# Altium footprint library MyLib.PcbLib: 575 footprints (part 4 of 36)
Each footprint in its own frame and in the unit in brackets; x right, y up, seen from the top. Pads: shape width x height; smd on the part's side, far side on the other; paste and mask are expansions set on the pad; w line width, h text height; cw(c..) or ccw(c..) is an arc to the next point about the centre after c.
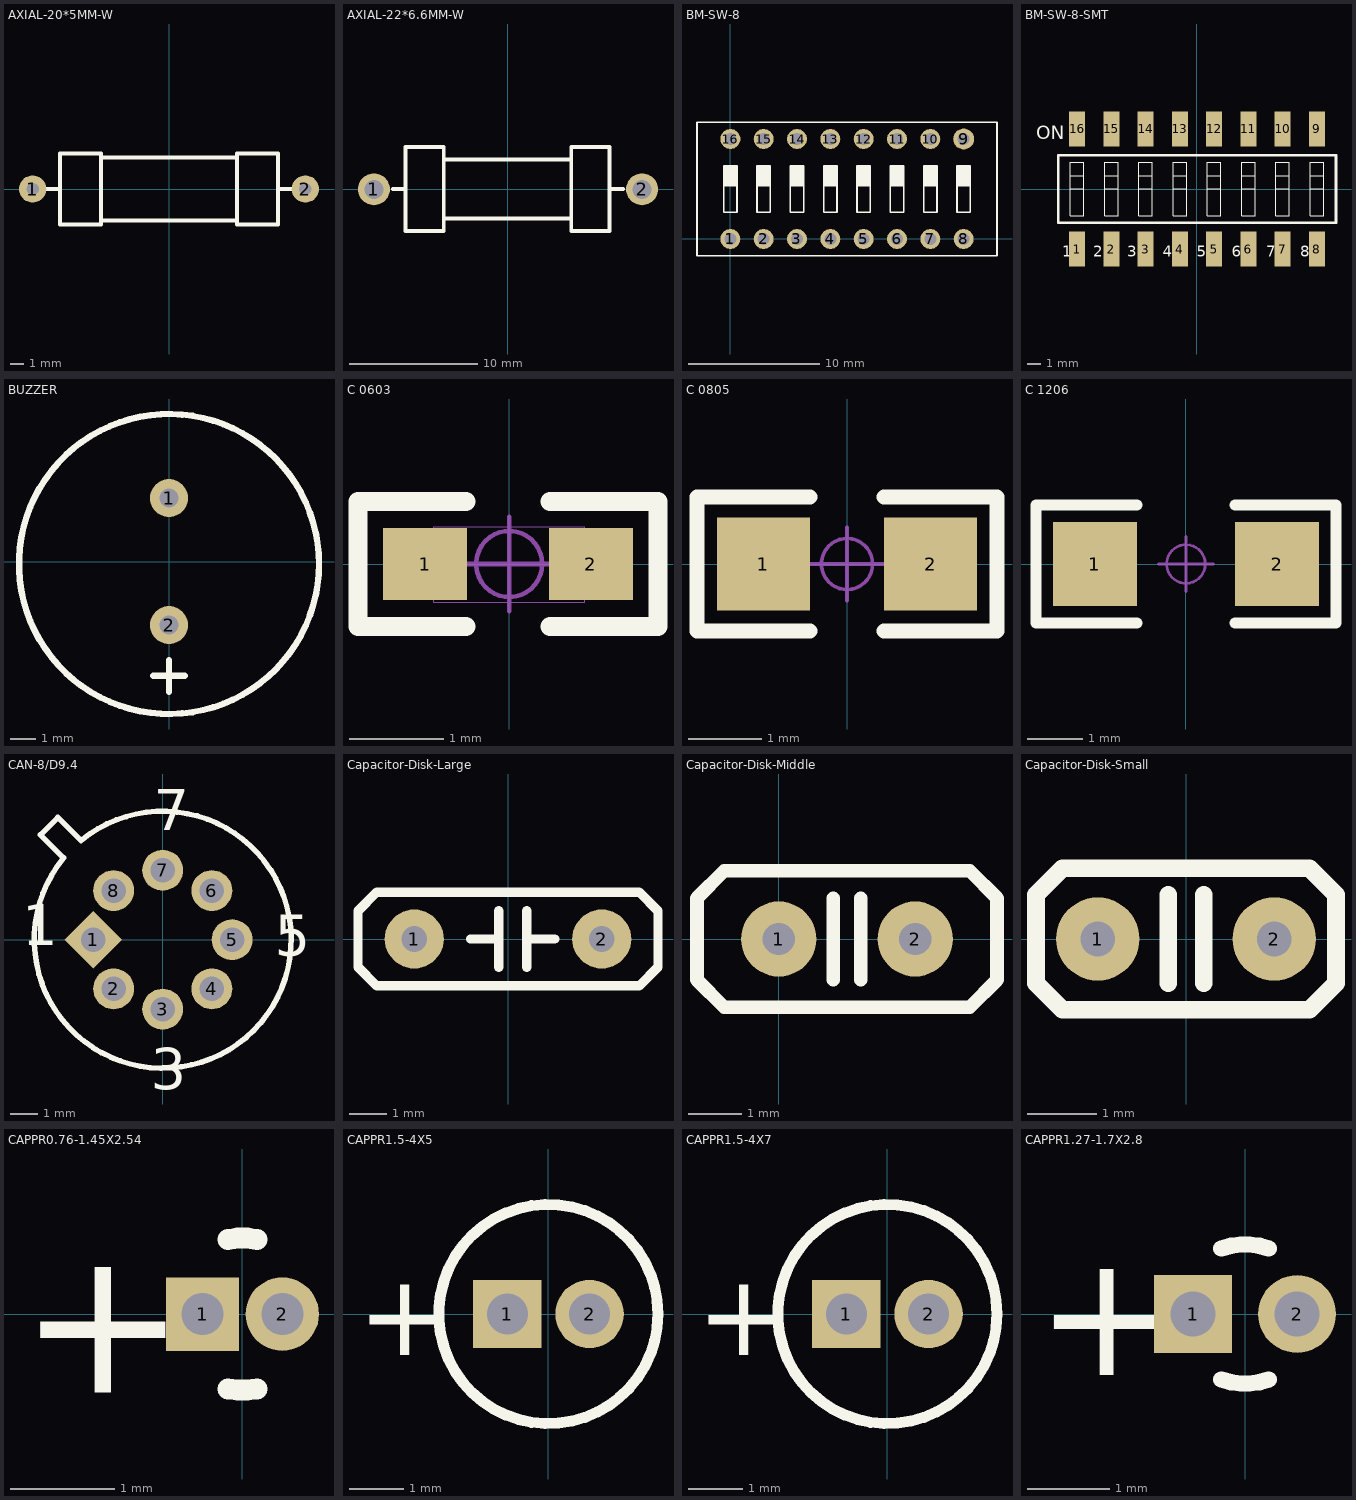
[diagram p3: the footprints below, top view; thin cyan lines are the x and y axes]

## AXIAL-20*5MM-W [mm] "2W电阻"
height 10
pads (2):
  round 2 hole 0.9: 1(-10,0) 2(10,0)
Top Overlay:
  lines w0.3: -5,-2.6 -5,-2 -5,2 -5,2.6 ; -5,-2.3 5,-2.3 ; -5,2.3 5,2.3 ; 5,-2.6 5,-2 5,2 5,2.6
  lines w0.305: -8.983,0 -8,0 ; -5,-2.6 -8,-2.6 -8,2.6 -5,2.6 ; 5,-2.6 8,-2.6 8,2.6 5,2.6 ; 8,0 9.068,0
3D body "User Library-res_20x20.STEP": height 5.8, standoff -1.4, extent -10.425,-2.515 10.375,2.485

## AXIAL-22*6.6MM-W [mm] "2W电阻"
height 10
pads (2):
  round 2.5 hole 1.5: 1(-10.465,-0.025) 2(10.541,-0.025)
Top Overlay:
  lines w0.3: -5,-3.3 -5,3.3 ; -5,-2.6 -5,-2 ; -5,-2.3 5,-2.3 ; -5,2 -5,2.6 ; -5,2.3 5,2.3 ; 5,-3.3 5,3.3 ; 5,-2.6 5,-2 ; 5,2 5,2.6
  lines w0.305: -8.983,0 -8,0 ; -5,-3.3 -8,-3.3 -8,3.3 -5,3.3 ; 5,-3.3 8,-3.3 8,3.3 5,3.3 ; 8,0 9.068,0
3D body "SW3dPS-AXIAL_RESISTOR(3W).STEP": height 8.3, standoff -2, extent -10.998,-3.249 11.202,3.351

## BM-SW-8 [mil]
pads (16):
  round 60 hole 36: 1(0,0) 2(100,0) 3(200,0) 4(300,0) 5(400,0) 6(500,0) 7(600,0) 8(700,0) 10(600,300) 11(500,300) 12(400,300) 13(300,300) 14(200,300) 15(100,300) 16(0,300)
  round 62.99 hole 36: 9(700,300)
Top Overlay:
  rectangle: 580,160 620,220
  rectangle: 680,160 720,220
  rectangle: 280,160 320,220
  rectangle: 380,160 420,220
  rectangle: 480,160 520,220
  rectangle: 580,160 620,220
  rectangle: -20,160 20,220
  rectangle: 80,160 120,220
  rectangle: 180,160 220,220
  rectangle: 280,160 320,220
  lines w5: -20,160 20,160 ; 80,160 120,160 ; 180,160 220,160 ; 200,-50 700,-50 ; 200,350 700,350 ; 380,160 420,160 ; 400,-50 -100,-50 -100,350 400,350 ; 480,160 520,160 ; 500,-50 800,-50 800,350 500,350 ; 680,160 720,160 ; 280,80 280,220 ; 280,80 320,80 ; 280,80 280,220 ; 280,80 320,80 ; 280,220 320,220 ; 280,220 320,220 ; 320,80 320,220 ; 320,80 320,220 ; 580,80 580,220 ; 580,80 620,80 ; 580,80 580,220 ; 580,80 620,80 ; 580,220 620,220 ; 580,220 620,220 ; 620,80 620,220 ; 620,80 620,220 ; 680,80 680,220 ; 680,80 720,80 ; 680,80 680,220 ; 680,80 720,80 ; 680,220 720,220 ; 680,220 720,220 ; 720,80 720,220 ; 720,80 720,220 ; -20,80 -20,220 20,220 20,80 -20,80 ; 80,80 80,220 120,220 120,80 80,80 ; 180,80 180,220 220,220 220,80 180,80 ; 280,160 320,160 280,160 ; 380,80 380,220 420,220 420,80 380,80 ; 480,80 480,220 520,220 520,80 480,80 ; 580,160 620,160 580,160
3D body "SWITCH_DIP8.step": height 275.59, standoff 0, extent -83.07,-47 783.07,346.7

## BM-SW-8-SMT [mm]
pads (16):
  rect 1.2x2.6 smd: 1(-8.89,-4.45) 2(-6.35,-4.45) 3(-3.81,-4.45) 4(-1.27,-4.45) 5(1.27,-4.45) 6(3.81,-4.45) 7(6.35,-4.45) 8(8.89,-4.45) 9(8.89,4.45) 10(6.35,4.45) 11(3.81,4.45) 12(1.27,4.45) 13(-1.27,4.45) 14(-3.81,4.45) 15(-6.35,4.45) 16(-8.89,4.45)
Top Overlay:
  lines w0.025: -9.39,0 -8.39,0 ; -9.39,1 -8.39,1 ; -6.85,0 -5.85,0 ; -6.85,1 -5.85,1 ; -4.31,0 -3.31,0 ; -4.31,1 -3.31,1 ; -1.77,0 -0.77,0 ; -1.77,1 -0.77,1 ; 0.77,0 1.77,0 ; 0.77,1 1.77,1 ; 3.31,0 4.31,0 ; 3.31,1 4.31,1 ; 5.85,0 6.85,0 ; 5.85,1 6.85,1 ; 8.39,0 9.39,0 ; 8.39,1 9.39,1 ; -9.39,-2 -8.39,-2 -8.39,2 -9.39,2 -9.39,-2 ; -6.85,-2 -5.85,-2 -5.85,2 -6.85,2 -6.85,-2 ; -4.31,-2 -3.31,-2 -3.31,2 -4.31,2 -4.31,-2 ; -1.77,-2 -0.77,-2 -0.77,2 -1.77,2 -1.77,-2 ; 0.77,-2 1.77,-2 1.77,2 0.77,2 0.77,-2 ; 3.31,-2 4.31,-2 4.31,2 3.31,2 3.31,-2 ; 5.85,-2 6.85,-2 6.85,2 5.85,2 5.85,-2 ; 8.39,-2 9.39,-2 9.39,2 8.39,2 8.39,-2
  lines w0.2: -10.29,-2.5 10.31,-2.5 10.31,2.5 -10.29,2.5 -10.29,-2.5
  text "8" at 7.659,-5.032 h0.8
  text "7" at 5.119,-5.032 h0.8
  text "ON" at -11.938,3.678 h1
  text "1" at -10.006,-5.032 h0.8
  text "2" at -7.681,-5.032 h0.8
  text "3" at -5.181,-5.032 h0.8
  text "4" at -2.556,-5.032 h0.8
  text "5" at -0.031,-5.032 h0.8
  text "6" at 2.569,-5.032 h0.8
3D body "SWITCH_DIP8.step": height 7, standoff 0, extent -11.056,-5.057 10.944,4.943

## BUZZER [mil]
height 314.96
pads (2):
  round 60 hole 30: 1(0,100) 2(0,-100)
Top Overlay:
  circle w10: c0,-3.78 r236.22
  lines w10: -25,-180 25,-180 ; 0,-205 0,-155
3D body "Buzzer.STEP": height 236.22, standoff -78.74, extent -236.25,-236.25 236.27,236.27

## C 0603 [mil] "无极性贴片电容"
height 400
pads (2):
  rect 35x30 smd: 1(-35,0) 2(34,0)
Top Overlay:
  lines w8: -18,-26 -63,-26 -63,26 -18,26 ; 17,-26 62,-26 62,26 17,26
Mechanical 13:
  lines w0.39: -31.5,-16 31.5,-16 31.5,15.5 -31.5,15.5 -31.5,-16
Mechanical 15:
  circle w1.97: c0,0 r13.78
  lines w1.97: -19.68,0 19.69,0 ; 0,-19.69 0,19.68
3D body "C 0603.STEP": height 31.89, standoff -0.39, extent -31.5,-16.14 31.5,16.14

## C 0805 [mil] "无极性贴片电容"
height 19.68
pads (2):
  rect 50x50 smd: 1(-45,0) 2(45,0)
Top Overlay:
  lines w8: -20,-36 -80.71,-36 -80.71,36 -20,36 ; 20,-36 80.71,-36 80.71,36 20,36
Mechanical 15:
  circle w1.97: c0,0 r13.78
  lines w1.97: -19.69,0 19.68,0 ; 0,-19.69 0,19.68
3D body "C 0805.STEP": height 20.08, standoff -0.39, extent -39.37,-24.02 39.37,24.02

## C 1206 [mil] "无极性贴片电容"
height 400
pads (2):
  rect 60x60 smd: 1(-65,0) 2(65,0)
Top Overlay:
  lines w8: -35,-42 -107,-42 -107,42 -35,42 ; 35,-42 107,-42 107,42 35,42
Mechanical 15:
  circle w1.97: c0,0 r13.78
  lines w1.97: -19.68,0 19.69,0 ; 0,-19.68 0,19.69
3D body "C 1206.STEP": height 47.64, standoff -0.39, extent -62.99,-31.89 62.99,31.89

## CAN-8/D9.4 [mm]
pads (8):
  rect 1.5x1.5 hole 0.9 rot 45: 1(-2.54,0)
  round 1.5 hole 0.9: 2(-1.796,-1.796) 3(0,-2.54) 4(1.796,-1.796) 5(2.54,0) 6(1.796,1.796) 7(0,2.54) 8(-1.796,1.796)
Top Overlay:
  lines w0.2: -4.475,3.838 -3.838,4.475 -2.99,3.626 cw(c0,0) -3.626,2.99 -4.475,3.838
  text "1" at -5.131,-0.203 h1.5
  text "3" at -0.432,-5.461 h1.5
  text "5" at 4.089,-0.584 h1.5
  text "7" at -0.33,4.013 h1.5
3D body: height 14, standoff 4, extent -4.549,-4.549 4.549,4.549
3D body: height 4, standoff -2, extent -0.439,-2.986 0.353,-2.193
3D body: height 4, standoff -2, extent 1.389,-2.199 2.182,-1.406
3D body: height 4, standoff -2, extent 2.151,-0.395 2.944,0.397
3D body: height 4, standoff -2, extent -0.389,2.145 0.404,2.937
3D body: height 4, standoff -2, extent 1.415,1.408 2.207,2.201
3D body: height 4, standoff -2, extent -2.192,-2.173 -1.4,-1.381
3D body: height 4, standoff -2, extent -2.903,-0.395 -2.111,0.397
3D body: height 4, standoff -2, extent -2.192,1.408 -1.4,2.201

## Capacitor-Disk-Large [mm]
pads (2):
  round 1.6 hole 0.7: 1(-2.54,0) 2(2.54,0)
Top Overlay:
  lines w0.254: -1.016,0 -0.254,0 ; -0.254,-0.762 -0.254,0.762 ; 0.508,-0.762 0.508,0.762 ; 0.508,0 1.27,0 ; -4.064,-0.762 -4.064,0.762 -3.556,1.27 3.556,1.27 4.064,0.762 4.064,-0.762 3.556,-1.27 -3.556,-1.27 -4.064,-0.762
3D body "diskcapacitor1.STEP": height 8, standoff -2, extent -3.5,-1.024 3.5,1.076

## Capacitor-Disk-Middle [mm]
pads (2):
  round 1.4 hole 0.6: 1(0,0) 2(2.54,0)
Top Overlay:
  lines w0.254: 1.016,-0.762 1.016,0.762 ; 1.524,-0.762 1.524,0.762 ; -1.524,-0.762 -1.524,0.762 -1.016,1.27 3.556,1.27 4.064,0.762 4.064,-0.762 3.556,-1.27 -1.016,-1.27 -1.524,-0.762
3D body "diskcapacitor2.STEP": height 7, standoff -2, extent -1.23,-1.1 3.77,1

## Capacitor-Disk-Small [mm]
pads (2):
  round 1.2 hole 0.5: 1(-1.27,0) 2(1.27,0)
Top Overlay:
  lines w0.254: -0.254,-0.635 -0.254,0.635 ; 0.254,-0.635 0.254,0.635 ; -2.159,-0.635 -2.159,0.635 -1.778,1.016 1.778,1.016 2.159,0.635 2.159,-0.635 1.778,-1.016 -1.778,-1.016 -2.159,-0.635
3D body "diskcapacitor3.STEP": height 6.5, standoff -2, extent -2,-1.1 2,1

## CAPPR0.76-1.45X2.54 [mm]
pads (2):
  rect 0.7x0.7 hole 0.4: 1(-0.38,0)
  round 0.7 hole 0.4: 2(0.38,0)
Top Overlay:
  lines w0.2: -0.138,-0.712 ccw(c0,0) 0.138,-0.712 ; -0.138,0.712 cw(c0,0) 0.138,0.712
  text "+" at -2.129,-0.749 h1.5
3D body: height 2.54, standoff 0, extent -0.74,-0.74 0.74,0.74

## CAPPR1.5-4X5 [mm]
pads (2):
  rect 1.25x1.25 hole 0.75: 1(-0.75,0)
  round 1.25 hole 0.75: 2(0.75,0)
Top Overlay:
  circle w0.2: c0,0 r2
  text "+" at -3.475,-0.75 h1.5
3D body: height 5, standoff 0.2, extent -1.999,-1.999 1.999,1.999

## CAPPR1.5-4X7 [mm]
pads (2):
  rect 1.25x1.25 hole 0.75: 1(-0.75,0)
  round 1.25 hole 0.75: 2(0.75,0)
Top Overlay:
  circle w0.2: c0,0 r2
  text "+" at -3.475,-0.75 h1.5
3D body: height 7, standoff 0.2, extent -1.999,-1.999 1.999,1.999

## CAPPR1.27-1.7X2.8 [mm]
pads (2):
  rect 0.95x0.95 hole 0.55: 1(-0.635,0)
  round 0.95 hole 0.55: 2(0.635,0)
Top Overlay:
  lines w0.2: -0.291,-0.799 ccw(c0,0) 0.291,-0.799 ; -0.291,0.799 cw(c0,0) 0.291,0.799
  text "+" at -2.551,-0.749 h1.5
3D body: height 2.8, standoff 0, extent -0.898,-0.898 0.898,0.898